# Altium schematic symbol library jlcpcb_2025_04_inductors_extended_0603.schlib: 1269 symbols (part 1 of 7)
Pins are listed as number, name and electrical type; pins without a type are passive.

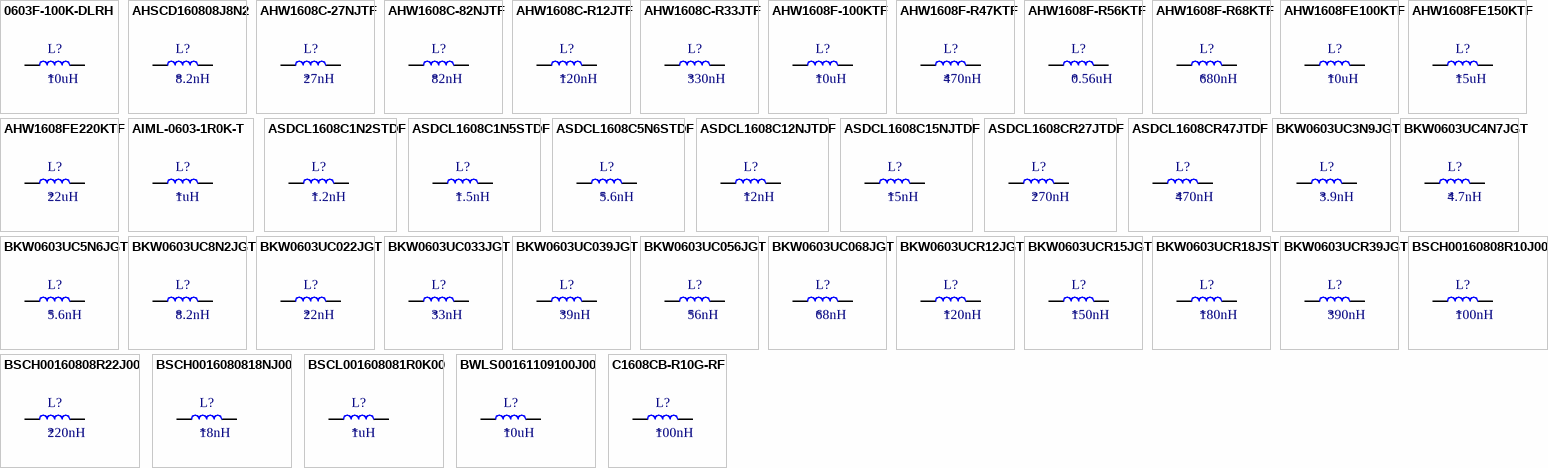
[diagram p0: symbols 0603F-100K-DLRH to C1608CB-R10G-RF]

## 0603F-100K-DLRH
designator L?  Inductance: 10uH
Inductor, 10uH, ±10%, SMD 0603; Manufacturer: PSA(Prosperity Dielectrics); Manufacturer Part Number: 0603F-100K-DLRH; Package Size: 0603; JLCPCB Basic Part: No; JLCPCB Part Number: C2874746; Supplier 1: LCSC; Category: Inductors; Supplier Part Number 1: C2874746; Tolerance: ±10%; RoHS: Yes; ComponentLink1Description: Datasheet; ComponentLink1URL: https://wmsc.lcsc.com/wmsc/upload/file/pdf/v2/lcsc/2108150330_PSA-Prosperity-Dielectrics-0603F-100K-DLRH_C2874746.pdf; ComponentLink2Description: JLCPCB Part URL; ComponentLink2URL: https://jlcpcb.com/partdetail/C2874746; ComponentLink3Description: LCSC Part URL; ComponentLink3URL: https://lcsc.com/product-detail/Inductors-SMD_PSAProsperity-Dielectrics-PSAProsperity-Dielectrics-0603F-100K-DLRH_C2874746.html
footprint IND-0603 (0603 (1608M) Inductor)
pins: 1, 2

## AHSCD160808J8N2
designator L?  Inductance: 8.2nH
Inductor, 8.2nH, ±5%, 115mΩ, 700mA, SMD 0603; Manufacturer: COILANK INTERNATIONAL; Manufacturer Part Number: AHSCD160808J8N2; Self-Resonant Frequency: 4.2GHz; Q Factor: 30; Package Size: 0603; JLCPCB Basic Part: No; JLCPCB Part Number: C3001597; Supplier 1: LCSC; Category: Inductors; Supplier Part Number 1: C3001597; Tolerance: ±5%; Rated Current: 700mA; DC Resistance: 115mΩ; RoHS: Yes; ComponentLink1Description: Datasheet; ComponentLink1URL: https://wmsc.lcsc.com/wmsc/upload/file/pdf/v2/lcsc/2204261415_COILANK-INTERNATIONAL-AHSCD160808J8N2_C3001597.pdf; ComponentLink2Description: JLCPCB Part URL; ComponentLink2URL: https://jlcpcb.com/partdetail/C3001597; ComponentLink3Description: LCSC Part URL; ComponentLink3URL: https://lcsc.com/product-detail/Inductors-SMD_COILANK-INTERNATIONAL-COILANK-INTERNATIONAL-AHSCD160808J8N2_C3001597.html
footprint IND-0603 (0603 (1608M) Inductor)
pins: 1, 2

## AHW1608C-27NJTF
designator L?  Inductance: 27nH
Inductor, 27nH, ±5%, 220mΩ, 600mA, SMD 0603; Manufacturer: APV; Manufacturer Part Number: AHW1608C-27NJTF; Self-Resonant Frequency: 2.8GHz; Q Factor: 40; Package Size: 0603; JLCPCB Basic Part: No; JLCPCB Part Number: C6807996; Supplier 1: LCSC; Category: Inductors; Supplier Part Number 1: C6807996; Tolerance: ±5%; Rated Current: 600mA; DC Resistance: 220mΩ; RoHS: Yes; ComponentLink1Description: Datasheet; ComponentLink1URL: https://wmsc.lcsc.com/wmsc/upload/file/pdf/v2/lcsc/2306211548_APV-AHW1608C-27NJTF_C6807996.pdf; ComponentLink2Description: JLCPCB Part URL; ComponentLink2URL: https://jlcpcb.com/partdetail/C6807996; ComponentLink3Description: LCSC Part URL; ComponentLink3URL: https://lcsc.com/product-detail/Inductors-SMD_APV-APV-AHW1608C-27NJTF_C6807996.html
footprint IND-0603 (0603 (1608M) Inductor)
pins: 1, 2

## AHW1608C-82NJTF
designator L?  Inductance: 82nH
Inductor, 82nH, ±5%, 0.54Ω, 400mA, SMD 0603; Manufacturer: APV; Manufacturer Part Number: AHW1608C-82NJTF; Self-Resonant Frequency: 1.7GHz; Q Factor: 34; Package Size: 0603; JLCPCB Basic Part: No; JLCPCB Part Number: C6808000; Supplier 1: LCSC; Category: Inductors; Supplier Part Number 1: C6808000; Tolerance: ±5%; Rated Current: 400mA; DC Resistance: 0.54Ω; RoHS: Yes; ComponentLink1Description: Datasheet; ComponentLink1URL: https://wmsc.lcsc.com/wmsc/upload/file/pdf/v2/lcsc/2306211548_APV-AHW1608C-82NJTF_C6808000.pdf; ComponentLink2Description: JLCPCB Part URL; ComponentLink2URL: https://jlcpcb.com/partdetail/C6808000; ComponentLink3Description: LCSC Part URL; ComponentLink3URL: https://lcsc.com/product-detail/Inductors-SMD_APV-APV-AHW1608C-82NJTF_C6808000.html
footprint IND-0603 (0603 (1608M) Inductor)
pins: 1, 2

## AHW1608C-R12JTF
designator L?  Inductance: 120nH
Inductor, 120nH, ±5%, 650mΩ, 300mA, SMD 0603; Manufacturer: APV; Manufacturer Part Number: AHW1608C-R12JTF; Self-Resonant Frequency: 1.3GHz; Q Factor: 32; Package Size: 0603; JLCPCB Basic Part: No; JLCPCB Part Number: C6364700; Supplier 1: LCSC; Category: Inductors; Supplier Part Number 1: C6364700; Tolerance: ±5%; Rated Current: 300mA; DC Resistance: 650mΩ; RoHS: Yes; ComponentLink1Description: Datasheet; ComponentLink1URL: https://wmsc.lcsc.com/wmsc/upload/file/pdf/v2/lcsc/2305231105_APV-AHW1608C-R12JTF_C6364700.pdf; ComponentLink2Description: JLCPCB Part URL; ComponentLink2URL: https://jlcpcb.com/partdetail/C6364700; ComponentLink3Description: LCSC Part URL; ComponentLink3URL: https://lcsc.com/product-detail/Inductors-SMD_APV-APV-AHW1608C-R12JTF_C6364700.html
footprint IND-0603 (0603 (1608M) Inductor)
pins: 1, 2

## AHW1608C-R33JTF
designator L?  Inductance: 330nH
Inductor, 330nH, ±5%, 3.89Ω, 100mA, SMD 0603; Manufacturer: APV; Manufacturer Part Number: AHW1608C-R33JTF; Self-Resonant Frequency: 790MHz; Q Factor: 25; Package Size: 0603; JLCPCB Basic Part: No; JLCPCB Part Number: C6808006; Supplier 1: LCSC; Category: Inductors; Supplier Part Number 1: C6808006; Tolerance: ±5%; Rated Current: 100mA; DC Resistance: 3.89Ω; RoHS: Yes; ComponentLink1Description: Datasheet; ComponentLink1URL: https://wmsc.lcsc.com/wmsc/upload/file/pdf/v2/lcsc/2306211548_APV-AHW1608C-R33JTF_C6808006.pdf; ComponentLink2Description: JLCPCB Part URL; ComponentLink2URL: https://jlcpcb.com/partdetail/C6808006; ComponentLink3Description: LCSC Part URL; ComponentLink3URL: https://lcsc.com/product-detail/Inductors-SMD_APV-APV-AHW1608C-R33JTF_C6808006.html
footprint IND-0603 (0603 (1608M) Inductor)
pins: 1, 2

## AHW1608F-100KTF
designator L?  Inductance: 10uH
Inductor, 10uH, ±10%, 4.8Ω, 180mA, SMD 0603; Manufacturer: APV; Manufacturer Part Number: AHW1608F-100KTF; Self-Resonant Frequency: 25MHz; Q Factor: 12; Package Size: 0603; JLCPCB Basic Part: No; JLCPCB Part Number: C6808009; Supplier 1: LCSC; Category: Inductors; Supplier Part Number 1: C6808009; Tolerance: ±10%; Rated Current: 180mA; DC Resistance: 4.8Ω; RoHS: Yes; ComponentLink1Description: Datasheet; ComponentLink1URL: https://wmsc.lcsc.com/wmsc/upload/file/pdf/v2/lcsc/2306211548_APV-AHW1608F-100KTF_C6808009.pdf; ComponentLink2Description: JLCPCB Part URL; ComponentLink2URL: https://jlcpcb.com/partdetail/C6808009; ComponentLink3Description: LCSC Part URL; ComponentLink3URL: https://lcsc.com/product-detail/Inductors-SMD_APV-APV-AHW1608F-100KTF_C6808009.html
footprint IND-0603 (0603 (1608M) Inductor)
pins: 1, 2

## AHW1608F-R47KTF
designator L?  Inductance: 470nH
Inductor, 470nH, ±10%, 430mΩ, 570mA, SMD 0603; Manufacturer: APV; Manufacturer Part Number: AHW1608F-R47KTF; Self-Resonant Frequency: 540MHz; Q Factor: 12; Package Size: 0603; JLCPCB Basic Part: No; JLCPCB Part Number: C6808022; Supplier 1: LCSC; Category: Inductors; Supplier Part Number 1: C6808022; Tolerance: ±10%; Rated Current: 570mA; DC Resistance: 430mΩ; RoHS: Yes; ComponentLink1Description: Datasheet; ComponentLink1URL: https://wmsc.lcsc.com/wmsc/upload/file/pdf/v2/lcsc/2306211549_APV-AHW1608F-R47KTF_C6808022.pdf; ComponentLink2Description: JLCPCB Part URL; ComponentLink2URL: https://jlcpcb.com/partdetail/C6808022; ComponentLink3Description: LCSC Part URL; ComponentLink3URL: https://lcsc.com/product-detail/Inductors-SMD_APV-APV-AHW1608F-R47KTF_C6808022.html
footprint IND-0603 (0603 (1608M) Inductor)
pins: 1, 2

## AHW1608F-R56KTF
designator L?  Inductance: 0.56uH
Inductor, 0.56uH, ±10%, 0.65Ω, 400mA, SMD 0603; Manufacturer: APV; Manufacturer Part Number: AHW1608F-R56KTF; Self-Resonant Frequency: 600MHz; Q Factor: 12; Package Size: 0603; JLCPCB Basic Part: No; JLCPCB Part Number: C6808023; Supplier 1: LCSC; Category: Inductors; Supplier Part Number 1: C6808023; Tolerance: ±10%; Rated Current: 400mA; DC Resistance: 0.65Ω; RoHS: Yes; ComponentLink1Description: Datasheet; ComponentLink1URL: https://wmsc.lcsc.com/wmsc/upload/file/pdf/v2/lcsc/2306211549_APV-AHW1608F-R56KTF_C6808023.pdf; ComponentLink2Description: JLCPCB Part URL; ComponentLink2URL: https://jlcpcb.com/partdetail/C6808023; ComponentLink3Description: LCSC Part URL; ComponentLink3URL: https://lcsc.com/product-detail/Inductors-SMD_APV-APV-AHW1608F-R56KTF_C6808023.html
footprint IND-0603 (0603 (1608M) Inductor)
pins: 1, 2

## AHW1608F-R68KTF
designator L?  Inductance: 680nH
Inductor, 680nH, ±10%, 1Ω, 380mA, SMD 0603; Manufacturer: APV; Manufacturer Part Number: AHW1608F-R68KTF; Self-Resonant Frequency: 500MHz; Q Factor: 12; Package Size: 0603; JLCPCB Basic Part: No; JLCPCB Part Number: C6808024; Supplier 1: LCSC; Category: Inductors; Supplier Part Number 1: C6808024; Tolerance: ±10%; Rated Current: 380mA; DC Resistance: 1Ω; RoHS: Yes; ComponentLink1Description: Datasheet; ComponentLink1URL: https://wmsc.lcsc.com/wmsc/upload/file/pdf/v2/lcsc/2306211549_APV-AHW1608F-R68KTF_C6808024.pdf; ComponentLink2Description: JLCPCB Part URL; ComponentLink2URL: https://jlcpcb.com/partdetail/C6808024; ComponentLink3Description: LCSC Part URL; ComponentLink3URL: https://lcsc.com/product-detail/Inductors-SMD_APV-APV-AHW1608F-R68KTF_C6808024.html
footprint IND-0603 (0603 (1608M) Inductor)
pins: 1, 2

## AHW1608FE100KTF
designator L?  Inductance: 10uH
Inductor, 10uH, ±10%, 2.4Ω, 280mA, SMD 0603; Manufacturer: APV; Manufacturer Part Number: AHW1608FE100KTF; Self-Resonant Frequency: 36MHz; Q Factor: 14; Package Size: 0603; JLCPCB Basic Part: No; JLCPCB Part Number: C6808014; Supplier 1: LCSC; Category: Inductors; Supplier Part Number 1: C6808014; Tolerance: ±10%; Rated Current: 280mA; DC Resistance: 2.4Ω; RoHS: Yes; ComponentLink1Description: Datasheet; ComponentLink1URL: https://wmsc.lcsc.com/wmsc/upload/file/pdf/v2/lcsc/2308041746_APV-AHW1608FE100KTF_C6808014.pdf; ComponentLink2Description: JLCPCB Part URL; ComponentLink2URL: https://jlcpcb.com/partdetail/C6808014; ComponentLink3Description: LCSC Part URL; ComponentLink3URL: https://lcsc.com/product-detail/Inductors-SMD_APV-APV-AHW1608FE100KTF_C6808014.html
footprint IND-0603 (0603 (1608M) Inductor)
pins: 1, 2

## AHW1608FE150KTF
designator L?  Inductance: 15uH
Inductor, 15uH, ±10%, 3.38Ω, 220mA, SMD 0603; Manufacturer: APV; Manufacturer Part Number: AHW1608FE150KTF; Self-Resonant Frequency: 29MHz; Q Factor: 14; Package Size: 0603; JLCPCB Basic Part: No; JLCPCB Part Number: C6364707; Supplier 1: LCSC; Category: Inductors; Supplier Part Number 1: C6364707; Tolerance: ±10%; Rated Current: 220mA; DC Resistance: 3.38Ω; RoHS: Yes; ComponentLink1Description: Datasheet; ComponentLink1URL: https://wmsc.lcsc.com/wmsc/upload/file/pdf/v2/lcsc/2308041745_APV-AHW1608FE150KTF_C6364707.pdf; ComponentLink2Description: JLCPCB Part URL; ComponentLink2URL: https://jlcpcb.com/partdetail/C6364707; ComponentLink3Description: LCSC Part URL; ComponentLink3URL: https://lcsc.com/product-detail/Inductors-SMD_APV-APV-AHW1608FE150KTF_C6364707.html
footprint IND-0603 (0603 (1608M) Inductor)
pins: 1, 2

## AHW1608FE220KTF
designator L?  Inductance: 22uH
Inductor, 22uH, ±10%, 4.69Ω, 200mA, SMD 0603; Manufacturer: APV; Manufacturer Part Number: AHW1608FE220KTF; Self-Resonant Frequency: 24MHz; Q Factor: 14; Package Size: 0603; JLCPCB Basic Part: No; JLCPCB Part Number: C6808015; Supplier 1: LCSC; Category: Inductors; Supplier Part Number 1: C6808015; Tolerance: ±10%; Rated Current: 200mA; DC Resistance: 4.69Ω; RoHS: Yes; ComponentLink1Description: Datasheet; ComponentLink1URL: https://wmsc.lcsc.com/wmsc/upload/file/pdf/v2/lcsc/2308041746_APV-AHW1608FE220KTF_C6808015.pdf; ComponentLink2Description: JLCPCB Part URL; ComponentLink2URL: https://jlcpcb.com/partdetail/C6808015; ComponentLink3Description: LCSC Part URL; ComponentLink3URL: https://lcsc.com/product-detail/Inductors-SMD_APV-APV-AHW1608FE220KTF_C6808015.html
footprint IND-0603 (0603 (1608M) Inductor)
pins: 1, 2

## AIML-0603-1R0K-T
designator L?  Inductance: 1uH
Inductor, 1uH, ±10%, 600mΩ, 25mA, SMD 0603; Manufacturer: Abracon LLC; Manufacturer Part Number: AIML-0603-1R0K-T; Self-Resonant Frequency: 125MHz; Q Factor: 35@10MHz; Package Size: 0603; JLCPCB Basic Part: No; JLCPCB Part Number: C2041516; Supplier 1: LCSC; Category: Inductors; Supplier Part Number 1: C2041516; Tolerance: ±10%; Rated Current: 25mA; DC Resistance: 600mΩ; RoHS: Yes; ComponentLink1Description: Datasheet; ComponentLink1URL: https://wmsc.lcsc.com/wmsc/upload/file/pdf/v2/lcsc/2304140030_Abracon-LLC-AIML-0603-1R0K-T_C2041516.pdf; ComponentLink2Description: JLCPCB Part URL; ComponentLink2URL: https://jlcpcb.com/partdetail/C2041516; ComponentLink3Description: LCSC Part URL; ComponentLink3URL: https://lcsc.com/product-detail/Inductors-SMD_Abracon-LLC-Abracon-LLC-AIML-0603-1R0K-T_C2041516.html
footprint IND-0603 (0603 (1608M) Inductor)
pins: 1, 2

## ASDCL1608C1N2STDF
designator L?  Inductance: 1.2nH
Inductor, 1.2nH, 50mΩ, 500mA, SMD 0603; Manufacturer: Sunlord; Manufacturer Part Number: ASDCL1608C1N2STDF; Self-Resonant Frequency: 10GHz; Q Factor: 8@100MHz; Package Size: 0603; JLCPCB Basic Part: No; JLCPCB Part Number: C2846485; Supplier 1: LCSC; Category: Inductors; Supplier Part Number 1: C2846485; Rated Current: 500mA; DC Resistance: 50mΩ; RoHS: Yes; ComponentLink1Description: Datasheet; ComponentLink1URL: https://wmsc.lcsc.com/wmsc/upload/file/pdf/v2/lcsc/2310301640_Sunlord-ASDCL1608C1N2STDF_C2846485.pdf; ComponentLink2Description: JLCPCB Part URL; ComponentLink2URL: https://jlcpcb.com/partdetail/C2846485; ComponentLink3Description: LCSC Part URL; ComponentLink3URL: https://lcsc.com/product-detail/Inductors-SMD_Sunlord-Sunlord-ASDCL1608C1N2STDF_C2846485.html
footprint IND-0603 (0603 (1608M) Inductor)
pins: 1, 2

## ASDCL1608C1N5STDF
designator L?  Inductance: 1.5nH
Inductor, 1.5nH, 100mΩ, 500mA, SMD 0603; Manufacturer: Sunlord; Manufacturer Part Number: ASDCL1608C1N5STDF; Self-Resonant Frequency: 6GHz; Q Factor: 8@100MHz; Package Size: 0603; JLCPCB Basic Part: No; JLCPCB Part Number: C2846486; Supplier 1: LCSC; Category: Inductors; Supplier Part Number 1: C2846486; Rated Current: 500mA; DC Resistance: 100mΩ; RoHS: Yes; ComponentLink1Description: Datasheet; ComponentLink1URL: https://wmsc.lcsc.com/wmsc/upload/file/pdf/v2/lcsc/2310301640_Sunlord-ASDCL1608C1N5STDF_C2846486.pdf; ComponentLink2Description: JLCPCB Part URL; ComponentLink2URL: https://jlcpcb.com/partdetail/C2846486; ComponentLink3Description: LCSC Part URL; ComponentLink3URL: https://lcsc.com/product-detail/Inductors-SMD_Sunlord-Sunlord-ASDCL1608C1N5STDF_C2846486.html
footprint IND-0603 (0603 (1608M) Inductor)
pins: 1, 2

## ASDCL1608C5N6STDF
designator L?  Inductance: 5.6nH
Inductor, 5.6nH, 500mA, SMD 0603; Manufacturer: Sunlord; Manufacturer Part Number: ASDCL1608C5N6STDF; Package Size: 0603; JLCPCB Basic Part: No; JLCPCB Part Number: C2846493; Supplier 1: LCSC; Category: Inductors; Supplier Part Number 1: C2846493; Rated Current: 500mA; RoHS: Yes; ComponentLink1Description: Datasheet; ComponentLink1URL: https://wmsc.lcsc.com/wmsc/upload/file/pdf/v2/lcsc/2310301640_Sunlord-ASDCL1608C5N6STDF_C2846493.pdf; ComponentLink2Description: JLCPCB Part URL; ComponentLink2URL: https://jlcpcb.com/partdetail/C2846493; ComponentLink3Description: LCSC Part URL; ComponentLink3URL: https://lcsc.com/product-detail/Inductors-SMD_Sunlord-Sunlord-ASDCL1608C5N6STDF_C2846493.html
footprint IND-0603 (0603 (1608M) Inductor)
pins: 1, 2

## ASDCL1608C12NJTDF
designator L?  Inductance: 12nH
Inductor, 12nH, ±5%, 450mΩ, 300mA, SMD 0603; Manufacturer: Sunlord; Manufacturer Part Number: ASDCL1608C12NJTDF; Self-Resonant Frequency: 3GHz; Q Factor: 12@100MHz; Package Size: 0603; JLCPCB Basic Part: No; JLCPCB Part Number: C2846497; Supplier 1: LCSC; Category: Inductors; Supplier Part Number 1: C2846497; Tolerance: ±5%; Rated Current: 300mA; DC Resistance: 450mΩ; RoHS: Yes; ComponentLink1Description: Datasheet; ComponentLink1URL: https://wmsc.lcsc.com/wmsc/upload/file/pdf/v2/lcsc/2310301640_Sunlord-ASDCL1608C12NJTDF_C2846497.pdf; ComponentLink2Description: JLCPCB Part URL; ComponentLink2URL: https://jlcpcb.com/partdetail/C2846497; ComponentLink3Description: LCSC Part URL; ComponentLink3URL: https://lcsc.com/product-detail/Inductors-SMD_Sunlord-Sunlord-ASDCL1608C12NJTDF_C2846497.html
footprint IND-0603 (0603 (1608M) Inductor)
pins: 1, 2

## ASDCL1608C15NJTDF
designator L?  Inductance: 15nH
Inductor, 15nH, ±5%, 500mΩ, 300mA, SMD 0603; Manufacturer: Sunlord; Manufacturer Part Number: ASDCL1608C15NJTDF; Self-Resonant Frequency: 2.3GHz; Q Factor: 12@100MHz; Package Size: 0603; JLCPCB Basic Part: No; JLCPCB Part Number: C2846498; Supplier 1: LCSC; Category: Inductors; Supplier Part Number 1: C2846498; Tolerance: ±5%; Rated Current: 300mA; DC Resistance: 500mΩ; RoHS: Yes; ComponentLink1Description: Datasheet; ComponentLink1URL: https://wmsc.lcsc.com/wmsc/upload/file/pdf/v2/lcsc/2310301640_Sunlord-ASDCL1608C15NJTDF_C2846498.pdf; ComponentLink2Description: JLCPCB Part URL; ComponentLink2URL: https://jlcpcb.com/partdetail/C2846498; ComponentLink3Description: LCSC Part URL; ComponentLink3URL: https://lcsc.com/product-detail/Inductors-SMD_Sunlord-Sunlord-ASDCL1608C15NJTDF_C2846498.html
footprint IND-0603 (0603 (1608M) Inductor)
pins: 1, 2

## ASDCL1608CR27JTDF
designator L?  Inductance: 270nH
Inductor, 270nH, ±5%, 2.6Ω, 150mA, SMD 0603; Manufacturer: Sunlord; Manufacturer Part Number: ASDCL1608CR27JTDF; Self-Resonant Frequency: 350MHz; Q Factor: 8@50MHz; Package Size: 0603; JLCPCB Basic Part: No; JLCPCB Part Number: C2846513; Supplier 1: LCSC; Category: Inductors; Supplier Part Number 1: C2846513; Tolerance: ±5%; Rated Current: 150mA; DC Resistance: 2.6Ω; RoHS: Yes; ComponentLink1Description: Datasheet; ComponentLink1URL: https://wmsc.lcsc.com/wmsc/upload/file/pdf/v2/lcsc/2310301640_Sunlord-ASDCL1608CR27JTDF_C2846513.pdf; ComponentLink2Description: JLCPCB Part URL; ComponentLink2URL: https://jlcpcb.com/partdetail/C2846513; ComponentLink3Description: LCSC Part URL; ComponentLink3URL: https://lcsc.com/product-detail/Inductors-SMD_Sunlord-Sunlord-ASDCL1608CR27JTDF_C2846513.html
footprint IND-0603 (0603 (1608M) Inductor)
pins: 1, 2

## ASDCL1608CR47JTDF
designator L?  Inductance: 470nH
Inductor, 470nH, ±5%, 150mA, SMD 0603; Manufacturer: Sunlord; Manufacturer Part Number: ASDCL1608CR47JTDF; Package Size: 0603; JLCPCB Basic Part: No; JLCPCB Part Number: C2846517; Supplier 1: LCSC; Category: Inductors; Supplier Part Number 1: C2846517; Tolerance: ±5%; Rated Current: 150mA; RoHS: Yes; ComponentLink1Description: Datasheet; ComponentLink1URL: https://wmsc.lcsc.com/wmsc/upload/file/pdf/v2/lcsc/2310301640_Sunlord-ASDCL1608CR47JTDF_C2846517.pdf; ComponentLink2Description: JLCPCB Part URL; ComponentLink2URL: https://jlcpcb.com/partdetail/C2846517; ComponentLink3Description: LCSC Part URL; ComponentLink3URL: https://lcsc.com/product-detail/Inductors-SMD_Sunlord-Sunlord-ASDCL1608CR47JTDF_C2846517.html
footprint IND-0603 (0603 (1608M) Inductor)
pins: 1, 2

## BKW0603UC3N9JGT
designator L?  Inductance: 3.9nH
Inductor, 3.9nH, ±5%, 80mΩ, 700mA, SMD 0603; Manufacturer: FH-BK(Guangdong Fenghua Bangke Elec); Manufacturer Part Number: BKW0603UC3N9JGT; Package Size: 0603; JLCPCB Basic Part: No; JLCPCB Part Number: C98517; Supplier 1: LCSC; Category: Inductors; Supplier Part Number 1: C98517; Tolerance: ±5%; Rated Current: 700mA; DC Resistance: 80mΩ; RoHS: Yes; ComponentLink1Description: Datasheet; ComponentLink1URL: https://wmsc.lcsc.com/wmsc/upload/file/pdf/v2/lcsc/2304140030_FH-BK-Guangdong-Fenghua-Bangke-Elec-BKW0603UC3N9JGT_C98517.pdf; ComponentLink2Description: JLCPCB Part URL; ComponentLink2URL: https://jlcpcb.com/partdetail/C98517; ComponentLink3Description: LCSC Part URL; ComponentLink3URL: https://lcsc.com/product-detail/Inductors-SMD_FH-BKGuangdong-Fenghua-Bangke-Elec-FH-BKGuangdong-Fenghua-Bangke-Elec-BKW0603UC3N9JGT_C98517.html
footprint IND-0603 (0603 (1608M) Inductor)
pins: 1, 2

## BKW0603UC4N7JGT
designator L?  Inductance: 4.7nH
Inductor, 4.7nH, ±5%, 116mΩ, 700mA, SMD 0603; Manufacturer: FH-BK(Guangdong Fenghua Bangke Elec); Manufacturer Part Number: BKW0603UC4N7JGT; Package Size: 0603; JLCPCB Basic Part: No; JLCPCB Part Number: C98515; Supplier 1: LCSC; Category: Inductors; Supplier Part Number 1: C98515; Tolerance: ±5%; Rated Current: 700mA; DC Resistance: 116mΩ; RoHS: Yes; ComponentLink1Description: Datasheet; ComponentLink1URL: https://wmsc.lcsc.com/wmsc/upload/file/pdf/v2/lcsc/2304140030_FH-BK-Guangdong-Fenghua-Bangke-Elec-BKW0603UC4N7JGT_C98515.pdf; ComponentLink2Description: JLCPCB Part URL; ComponentLink2URL: https://jlcpcb.com/partdetail/C98515; ComponentLink3Description: LCSC Part URL; ComponentLink3URL: https://lcsc.com/product-detail/Inductors-SMD_FH-BKGuangdong-Fenghua-Bangke-Elec-FH-BKGuangdong-Fenghua-Bangke-Elec-BKW0603UC4N7JGT_C98515.html
footprint IND-0603 (0603 (1608M) Inductor)
pins: 1, 2

## BKW0603UC5N6JGT
designator L?  Inductance: 5.6nH
Inductor, 5.6nH, ±5%, 200mΩ, 700mA, SMD 0603; Manufacturer: FH-BK(Guangdong Fenghua Bangke Elec); Manufacturer Part Number: BKW0603UC5N6JGT; Package Size: 0603; JLCPCB Basic Part: No; JLCPCB Part Number: C98518; Supplier 1: LCSC; Category: Inductors; Supplier Part Number 1: C98518; Tolerance: ±5%; Rated Current: 700mA; DC Resistance: 200mΩ; RoHS: Yes; ComponentLink1Description: Datasheet; ComponentLink1URL: https://wmsc.lcsc.com/wmsc/upload/file/pdf/v2/lcsc/2304140030_FH-BK-Guangdong-Fenghua-Bangke-Elec-BKW0603UC5N6JGT_C98518.pdf; ComponentLink2Description: JLCPCB Part URL; ComponentLink2URL: https://jlcpcb.com/partdetail/C98518; ComponentLink3Description: LCSC Part URL; ComponentLink3URL: https://lcsc.com/product-detail/Inductors-SMD_FH-BKGuangdong-Fenghua-Bangke-Elec-FH-BKGuangdong-Fenghua-Bangke-Elec-BKW0603UC5N6JGT_C98518.html
footprint IND-0603 (0603 (1608M) Inductor)
pins: 1, 2

## BKW0603UC8N2JGT
designator L?  Inductance: 8.2nH
Inductor, 8.2nH, ±5%, 120mΩ, 700mA, SMD 0603; Manufacturer: FH-BK(Guangdong Fenghua Bangke Elec); Manufacturer Part Number: BKW0603UC8N2JGT; Package Size: 0603; JLCPCB Basic Part: No; JLCPCB Part Number: C98519; Supplier 1: LCSC; Category: Inductors; Supplier Part Number 1: C98519; Tolerance: ±5%; Rated Current: 700mA; DC Resistance: 120mΩ; RoHS: Yes; ComponentLink1Description: Datasheet; ComponentLink1URL: https://wmsc.lcsc.com/wmsc/upload/file/pdf/v2/lcsc/2304140030_FH-BK-Guangdong-Fenghua-Bangke-Elec-BKW0603UC8N2JGT_C98519.pdf; ComponentLink2Description: JLCPCB Part URL; ComponentLink2URL: https://jlcpcb.com/partdetail/C98519; ComponentLink3Description: LCSC Part URL; ComponentLink3URL: https://lcsc.com/product-detail/Inductors-SMD_FH-BKGuangdong-Fenghua-Bangke-Elec-FH-BKGuangdong-Fenghua-Bangke-Elec-BKW0603UC8N2JGT_C98519.html
footprint IND-0603 (0603 (1608M) Inductor)
pins: 1, 2

## BKW0603UC022JGT
designator L?  Inductance: 22nH
Inductor, 22nH, ±5%, 190mΩ, 700mA, SMD 0603; Manufacturer: FH-BK(Guangdong Fenghua Bangke Elec); Manufacturer Part Number: BKW0603UC022JGT; Package Size: 0603; JLCPCB Basic Part: No; JLCPCB Part Number: C98525; Supplier 1: LCSC; Category: Inductors; Supplier Part Number 1: C98525; Tolerance: ±5%; Rated Current: 700mA; DC Resistance: 190mΩ; RoHS: Yes; ComponentLink1Description: Datasheet; ComponentLink1URL: https://wmsc.lcsc.com/wmsc/upload/file/pdf/v2/lcsc/2304140030_FH-BK-Guangdong-Fenghua-Bangke-Elec-BKW0603UC022JGT_C98525.pdf; ComponentLink2Description: JLCPCB Part URL; ComponentLink2URL: https://jlcpcb.com/partdetail/C98525; ComponentLink3Description: LCSC Part URL; ComponentLink3URL: https://lcsc.com/product-detail/Inductors-SMD_FH-BKGuangdong-Fenghua-Bangke-Elec-FH-BKGuangdong-Fenghua-Bangke-Elec-BKW0603UC022JGT_C98525.html
footprint IND-0603 (0603 (1608M) Inductor)
pins: 1, 2

## BKW0603UC033JGT
designator L?  Inductance: 33nH
Inductor, 33nH, ±5%, 220mΩ, 600mA, SMD 0603; Manufacturer: FH-BK(Guangdong Fenghua Bangke Elec); Manufacturer Part Number: BKW0603UC033JGT; Package Size: 0603; JLCPCB Basic Part: No; JLCPCB Part Number: C98529; Supplier 1: LCSC; Category: Inductors; Supplier Part Number 1: C98529; Tolerance: ±5%; Rated Current: 600mA; DC Resistance: 220mΩ; RoHS: Yes; ComponentLink1Description: Datasheet; ComponentLink1URL: https://wmsc.lcsc.com/wmsc/upload/file/pdf/v2/lcsc/2304140030_FH-BK-Guangdong-Fenghua-Bangke-Elec-BKW0603UC033JGT_C98529.pdf; ComponentLink2Description: JLCPCB Part URL; ComponentLink2URL: https://jlcpcb.com/partdetail/C98529; ComponentLink3Description: LCSC Part URL; ComponentLink3URL: https://lcsc.com/product-detail/Inductors-SMD_FH-BKGuangdong-Fenghua-Bangke-Elec-FH-BKGuangdong-Fenghua-Bangke-Elec-BKW0603UC033JGT_C98529.html
footprint IND-0603 (0603 (1608M) Inductor)
pins: 1, 2

## BKW0603UC039JGT
designator L?  Inductance: 39nH
Inductor, 39nH, ±5%, 250mΩ, 600mA, SMD 0603; Manufacturer: FH-BK(Guangdong Fenghua Bangke Elec); Manufacturer Part Number: BKW0603UC039JGT; Package Size: 0603; JLCPCB Basic Part: No; JLCPCB Part Number: C316243; Supplier 1: LCSC; Category: Inductors; Supplier Part Number 1: C316243; Tolerance: ±5%; Rated Current: 600mA; DC Resistance: 250mΩ; RoHS: Yes; ComponentLink1Description: Datasheet; ComponentLink1URL: https://wmsc.lcsc.com/wmsc/upload/file/pdf/v2/lcsc/1811011940_FH-BK-Guangdong-Fenghua-Bangke-Elec-BKW0603UC039JGT_C316243.pdf; ComponentLink2Description: JLCPCB Part URL; ComponentLink2URL: https://jlcpcb.com/partdetail/C316243; ComponentLink3Description: LCSC Part URL; ComponentLink3URL: https://lcsc.com/product-detail/Inductors-SMD_FH-BKGuangdong-Fenghua-Bangke-Elec-FH-BKGuangdong-Fenghua-Bangke-Elec-BKW0603UC039JGT_C316243.html
footprint IND-0603 (0603 (1608M) Inductor)
pins: 1, 2

## BKW0603UC056JGT
designator L?  Inductance: 56nH
Inductor, 56nH, ±5%, 280mΩ, 600mA, SMD 0603; Manufacturer: FH-BK(Guangdong Fenghua Bangke Elec); Manufacturer Part Number: BKW0603UC056JGT; Package Size: 0603; JLCPCB Basic Part: No; JLCPCB Part Number: C98523; Supplier 1: LCSC; Category: Inductors; Supplier Part Number 1: C98523; Tolerance: ±5%; Rated Current: 600mA; DC Resistance: 280mΩ; RoHS: Yes; ComponentLink1Description: Datasheet; ComponentLink1URL: https://wmsc.lcsc.com/wmsc/upload/file/pdf/v2/lcsc/2304140030_FH-BK-Guangdong-Fenghua-Bangke-Elec-BKW0603UC056JGT_C98523.pdf; ComponentLink2Description: JLCPCB Part URL; ComponentLink2URL: https://jlcpcb.com/partdetail/C98523; ComponentLink3Description: LCSC Part URL; ComponentLink3URL: https://lcsc.com/product-detail/Inductors-SMD_FH-BKGuangdong-Fenghua-Bangke-Elec-FH-BKGuangdong-Fenghua-Bangke-Elec-BKW0603UC056JGT_C98523.html
footprint IND-0603 (0603 (1608M) Inductor)
pins: 1, 2

## BKW0603UC068JGT
designator L?  Inductance: 68nH
Inductor, 68nH, ±5%, 340mΩ, 600mA, SMD 0603; Manufacturer: FH-BK(Guangdong Fenghua Bangke Elec); Manufacturer Part Number: BKW0603UC068JGT; Package Size: 0603; JLCPCB Basic Part: No; JLCPCB Part Number: C98522; Supplier 1: LCSC; Category: Inductors; Supplier Part Number 1: C98522; Tolerance: ±5%; Rated Current: 600mA; DC Resistance: 340mΩ; RoHS: Yes; ComponentLink1Description: Datasheet; ComponentLink1URL: https://wmsc.lcsc.com/wmsc/upload/file/pdf/v2/lcsc/2304140030_FH-BK-Guangdong-Fenghua-Bangke-Elec-BKW0603UC068JGT_C98522.pdf; ComponentLink2Description: JLCPCB Part URL; ComponentLink2URL: https://jlcpcb.com/partdetail/C98522; ComponentLink3Description: LCSC Part URL; ComponentLink3URL: https://lcsc.com/product-detail/Inductors-SMD_FH-BKGuangdong-Fenghua-Bangke-Elec-FH-BKGuangdong-Fenghua-Bangke-Elec-BKW0603UC068JGT_C98522.html
footprint IND-0603 (0603 (1608M) Inductor)
pins: 1, 2

## BKW0603UCR12JGT
designator L?  Inductance: 120nH
Inductor, 120nH, ±5%, 730mΩ, 300mA, SMD 0603; Manufacturer: FH-BK(Guangdong Fenghua Bangke Elec); Manufacturer Part Number: BKW0603UCR12JGT; Package Size: 0603; JLCPCB Basic Part: No; JLCPCB Part Number: C361661; Supplier 1: LCSC; Category: Inductors; Supplier Part Number 1: C361661; Tolerance: ±5%; Rated Current: 300mA; DC Resistance: 730mΩ; RoHS: Yes; ComponentLink1Description: Datasheet; ComponentLink1URL: https://wmsc.lcsc.com/wmsc/upload/file/pdf/v2/lcsc/1912111437_FH-BK-Guangdong-Fenghua-Bangke-Elec-BKW0603UCR12JGT_C361661.pdf; ComponentLink2Description: JLCPCB Part URL; ComponentLink2URL: https://jlcpcb.com/partdetail/C361661; ComponentLink3Description: LCSC Part URL; ComponentLink3URL: https://lcsc.com/product-detail/Inductors-SMD_FH-BKGuangdong-Fenghua-Bangke-Elec-FH-BKGuangdong-Fenghua-Bangke-Elec-BKW0603UCR12JGT_C361661.html
footprint IND-0603 (0603 (1608M) Inductor)
pins: 1, 2

## BKW0603UCR15JGT
designator L?  Inductance: 150nH
Inductor, 150nH, ±5%, 800mΩ, 280mA, SMD 0603; Manufacturer: FH-BK(Guangdong Fenghua Bangke Elec); Manufacturer Part Number: BKW0603UCR15JGT; Package Size: 0603; JLCPCB Basic Part: No; JLCPCB Part Number: C185913; Supplier 1: LCSC; Category: Inductors; Supplier Part Number 1: C185913; Tolerance: ±5%; Rated Current: 280mA; DC Resistance: 800mΩ; RoHS: Yes; ComponentLink1Description: Datasheet; ComponentLink1URL: https://wmsc.lcsc.com/wmsc/upload/file/pdf/v2/lcsc/2304140030_FH-BK-Guangdong-Fenghua-Bangke-Elec-BKW0603UCR15JGT_C185913.pdf; ComponentLink2Description: JLCPCB Part URL; ComponentLink2URL: https://jlcpcb.com/partdetail/C185913; ComponentLink3Description: LCSC Part URL; ComponentLink3URL: https://lcsc.com/product-detail/Inductors-SMD_FH-BKGuangdong-Fenghua-Bangke-Elec-FH-BKGuangdong-Fenghua-Bangke-Elec-BKW0603UCR15JGT_C185913.html
footprint IND-0603 (0603 (1608M) Inductor)
pins: 1, 2

## BKW0603UCR18JST
designator L?  Inductance: 180nH
Inductor, 180nH, ±5%, SMD 0603; Manufacturer: FH-BK(Guangdong Fenghua Bangke Elec); Manufacturer Part Number: BKW0603UCR18JST; Package Size: 0603; JLCPCB Basic Part: No; JLCPCB Part Number: C361662; Supplier 1: LCSC; Category: Inductors; Supplier Part Number 1: C361662; Tolerance: ±5%; RoHS: Yes; ComponentLink1Description: Datasheet; ComponentLink1URL: https://wmsc.lcsc.com/wmsc/upload/file/pdf/v2/lcsc/2304140030_FH-BK-Guangdong-Fenghua-Bangke-Elec-BKW0603UCR18JST_C361662.pdf; ComponentLink2Description: JLCPCB Part URL; ComponentLink2URL: https://jlcpcb.com/partdetail/C361662; ComponentLink3Description: LCSC Part URL; ComponentLink3URL: https://lcsc.com/product-detail/Inductors-SMD_FH-BKGuangdong-Fenghua-Bangke-Elec-FH-BKGuangdong-Fenghua-Bangke-Elec-BKW0603UCR18JST_C361662.html
footprint IND-0603 (0603 (1608M) Inductor)
pins: 1, 2

## BKW0603UCR39JGT
designator L?  Inductance: 390nH
Inductor, 390nH, ±5%, 4.35Ω, 100mA, SMD 0603; Manufacturer: FH-BK(Guangdong Fenghua Bangke Elec); Manufacturer Part Number: BKW0603UCR39JGT; Package Size: 0603; JLCPCB Basic Part: No; JLCPCB Part Number: C107477; Supplier 1: LCSC; Category: Inductors; Supplier Part Number 1: C107477; Tolerance: ±5%; Rated Current: 100mA; DC Resistance: 4.35Ω; RoHS: Yes; ComponentLink1Description: Datasheet; ComponentLink1URL: https://wmsc.lcsc.com/wmsc/upload/file/pdf/v2/lcsc/2304140030_FH-BK-Guangdong-Fenghua-Bangke-Elec-BKW0603UCR39JGT_C107477.pdf; ComponentLink2Description: JLCPCB Part URL; ComponentLink2URL: https://jlcpcb.com/partdetail/C107477; ComponentLink3Description: LCSC Part URL; ComponentLink3URL: https://lcsc.com/product-detail/Inductors-SMD_FH-BKGuangdong-Fenghua-Bangke-Elec-FH-BKGuangdong-Fenghua-Bangke-Elec-BKW0603UCR39JGT_C107477.html
footprint IND-0603 (0603 (1608M) Inductor)
pins: 1, 2

## BSCH00160808R10J00
designator L?  Inductance: 100nH
Inductor, 100nH, ±5%, SMD 0603; Manufacturer: Chilisin Elec; Manufacturer Part Number: BSCH00160808R10J00; Package Size: 0603; JLCPCB Basic Part: No; JLCPCB Part Number: C2981212; Supplier 1: LCSC; Category: Inductors; Supplier Part Number 1: C2981212; Tolerance: ±5%; RoHS: Yes; ComponentLink1Description: Datasheet; ComponentLink1URL: https://wmsc.lcsc.com/wmsc/upload/file/pdf/v2/lcsc/2203101903_Chilisin-Elec-BSCH00160808R10J00_C2981212.pdf; ComponentLink2Description: JLCPCB Part URL; ComponentLink2URL: https://jlcpcb.com/partdetail/C2981212; ComponentLink3Description: LCSC Part URL; ComponentLink3URL: https://lcsc.com/product-detail/Power-Inductors_Chilisin-Elec-Chilisin-Elec-BSCH00160808R10J00_C2981212.html
footprint IND-0603 (0603 (1608M) Inductor)
pins: 1, 2

## BSCH00160808R22J00
designator L?  Inductance: 220nH
Inductor, 220nH, ±5%, SMD 0603; Manufacturer: Chilisin Elec; Manufacturer Part Number: BSCH00160808R22J00; Package Size: 0603; JLCPCB Basic Part: No; JLCPCB Part Number: C3911145; Supplier 1: LCSC; Category: Inductors; Supplier Part Number 1: C3911145; Tolerance: ±5%; RoHS: Yes; ComponentLink1Description: Datasheet; ComponentLink1URL: https://wmsc.lcsc.com/wmsc/upload/file/pdf/v2/lcsc/2403291732_Chilisin-Elec-BSCH00160808R22J00_C3911145.pdf; ComponentLink2Description: JLCPCB Part URL; ComponentLink2URL: https://jlcpcb.com/partdetail/C3911145; ComponentLink3Description: LCSC Part URL; ComponentLink3URL: https://lcsc.com/product-detail/Power-Inductors_Chilisin-Elec-Chilisin-Elec-BSCH00160808R22J00_C3911145.html
footprint IND-0603 (0603 (1608M) Inductor)
pins: 1, 2

## BSCH0016080818NJ00
designator L?  Inductance: 18nH
Inductor, 18nH, ±5%, SMD 0603; Manufacturer: Chilisin Elec; Manufacturer Part Number: BSCH0016080818NJ00; Package Size: 0603; JLCPCB Basic Part: No; JLCPCB Part Number: C2981211; Supplier 1: LCSC; Category: Inductors; Supplier Part Number 1: C2981211; Tolerance: ±5%; RoHS: Yes; ComponentLink1Description: Datasheet; ComponentLink1URL: https://wmsc.lcsc.com/wmsc/upload/file/pdf/v2/lcsc/2203102158_Chilisin-Elec-BSCH0016080818NJ00_C2981211.pdf; ComponentLink2Description: JLCPCB Part URL; ComponentLink2URL: https://jlcpcb.com/partdetail/C2981211; ComponentLink3Description: LCSC Part URL; ComponentLink3URL: https://lcsc.com/product-detail/Power-Inductors_Chilisin-Elec-Chilisin-Elec-BSCH0016080818NJ00_C2981211.html
footprint IND-0603 (0603 (1608M) Inductor)
pins: 1, 2

## BSCL001608081R0K00
designator L?  Inductance: 1uH
Inductor, 1uH, ±10%, SMD 0603; Manufacturer: Chilisin Elec; Manufacturer Part Number: BSCL001608081R0K00; Package Size: 0603; JLCPCB Basic Part: No; JLCPCB Part Number: C2981213; Supplier 1: LCSC; Category: Inductors; Supplier Part Number 1: C2981213; Tolerance: ±10%; RoHS: Yes; ComponentLink1Description: Datasheet; ComponentLink1URL: https://wmsc.lcsc.com/wmsc/upload/file/pdf/v2/lcsc/2203101903_Chilisin-Elec-BSCL001608081R0K00_C2981213.pdf; ComponentLink2Description: JLCPCB Part URL; ComponentLink2URL: https://jlcpcb.com/partdetail/C2981213; ComponentLink3Description: LCSC Part URL; ComponentLink3URL: https://lcsc.com/product-detail/Power-Inductors_Chilisin-Elec-Chilisin-Elec-BSCL001608081R0K00_C2981213.html
footprint IND-0603 (0603 (1608M) Inductor)
pins: 1, 2

## BWLS00161109100J00
designator L?  Inductance: 10uH
Inductor, 10uH, ±5%, 4.8Ω, 300mA, SMD 0603; Manufacturer: Chilisin Elec; Manufacturer Part Number: BWLS00161109100J00; Self-Resonant Frequency: 40MHz; Q Factor: 19@7.9MHz; Package Size: 0603; JLCPCB Basic Part: No; JLCPCB Part Number: C2847098; Supplier 1: LCSC; Category: Inductors; Supplier Part Number 1: C2847098; Tolerance: ±5%; Rated Current: 300mA; DC Resistance: 4.8Ω; RoHS: Yes; ComponentLink1Description: Datasheet; ComponentLink1URL: https://wmsc.lcsc.com/wmsc/upload/file/pdf/v2/lcsc/2108142130_Chilisin-Elec-BWLS00161109100J00_C2847098.pdf; ComponentLink2Description: JLCPCB Part URL; ComponentLink2URL: https://jlcpcb.com/partdetail/C2847098; ComponentLink3Description: LCSC Part URL; ComponentLink3URL: https://lcsc.com/product-detail/Inductors-SMD_Chilisin-Elec-Chilisin-Elec-BWLS00161109100J00_C2847098.html
footprint IND-0603 (0603 (1608M) Inductor)
pins: 1, 2

## C1608CB-R10G-RF
designator L?  Inductance: 100nH
Inductor, 100nH, SMD 0603; Manufacturer: SAGAMI; Manufacturer Part Number: C1608CB-R10G-RF; Package Size: 0603; JLCPCB Basic Part: No; JLCPCB Part Number: C2944377; Supplier 1: LCSC; Category: Inductors; Supplier Part Number 1: C2944377; RoHS: Yes; ComponentLink1Description: Datasheet; ComponentLink1URL: https://wmsc.lcsc.com/wmsc/upload/file/pdf/v2/lcsc/2208241730_SAGAMI-C1608CB-R10G-RF_C2944377.pdf; ComponentLink2Description: JLCPCB Part URL; ComponentLink2URL: https://jlcpcb.com/partdetail/C2944377; ComponentLink3Description: LCSC Part URL; ComponentLink3URL: https://lcsc.com/product-detail/Inductors-SMD_SAGAMI-SAGAMI-C1608CB-R10G-RF_C2944377.html
footprint IND-0603 (0603 (1608M) Inductor)
pins: 1, 2

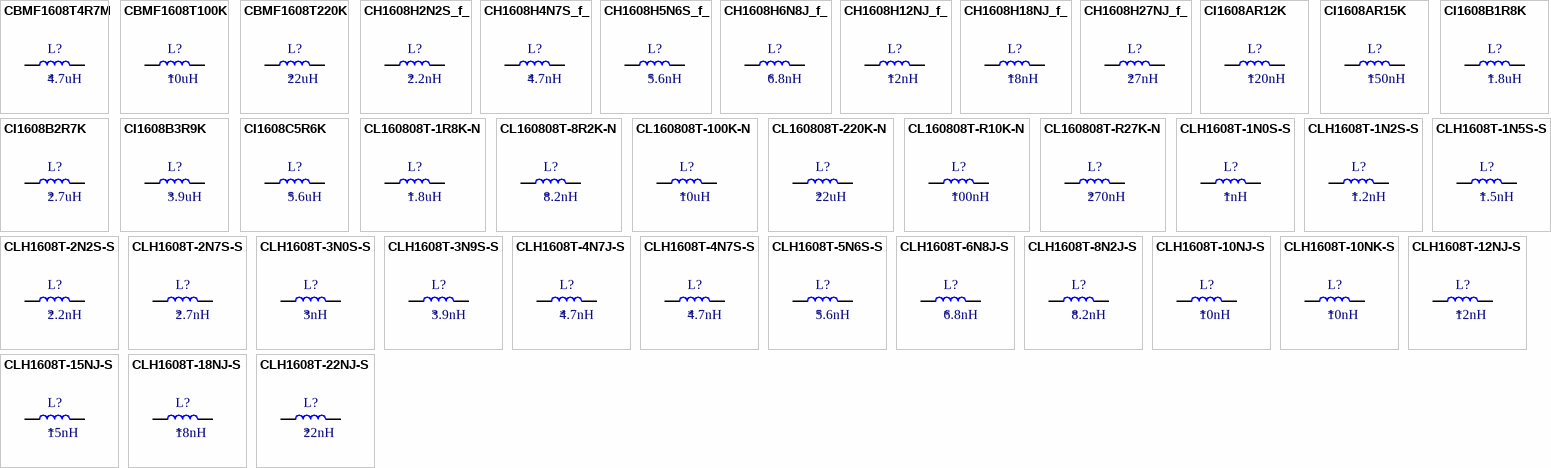
[diagram p1: symbols CBMF1608T4R7M to CLH1608T-22NJ-S]

## CBMF1608T4R7M
designator L?  Inductance: 4.7uH
Inductor, 4.7uH, ±20%, 312mΩ, 145mA, SMD 0603; Manufacturer: Taiyo Yuden; Manufacturer Part Number: CBMF1608T4R7M; Self-Resonant Frequency: 45MHz; Package Size: 0603; JLCPCB Basic Part: No; JLCPCB Part Number: C92984; Supplier 1: LCSC; Category: Inductors; Supplier Part Number 1: C92984; Tolerance: ±20%; Rated Current: 145mA; Saturation Current: 145mA; DC Resistance: 312mΩ; RoHS: Yes; ComponentLink1Description: Datasheet; ComponentLink1URL: https://wmsc.lcsc.com/wmsc/upload/file/pdf/v2/lcsc/1810091458_Taiyo-Yuden-CBMF1608T4R7M_C92984.pdf; ComponentLink2Description: JLCPCB Part URL; ComponentLink2URL: https://jlcpcb.com/partdetail/C92984; ComponentLink3Description: LCSC Part URL; ComponentLink3URL: https://lcsc.com/product-detail/Inductors-SMD_Taiyo-Yuden-Taiyo-Yuden-CBMF1608T4R7M_C92984.html
footprint IND-0603 (0603 (1608M) Inductor)
pins: 1, 2

## CBMF1608T100K
designator L?  Inductance: 10uH
Inductor, 10uH, ±10%, 468mΩ, 115mA, SMD 0603; Manufacturer: Taiyo Yuden; Manufacturer Part Number: CBMF1608T100K; Self-Resonant Frequency: 2.52MHz; Package Size: 0603; JLCPCB Basic Part: No; JLCPCB Part Number: C92982; Supplier 1: LCSC; Category: Inductors; Supplier Part Number 1: C92982; Tolerance: ±10%; Rated Current: 115mA; Saturation Current: 115mA; DC Resistance: 468mΩ; RoHS: Yes; ComponentLink1Description: Datasheet; ComponentLink1URL: https://wmsc.lcsc.com/wmsc/upload/file/pdf/v2/lcsc/2403251053_Taiyo-Yuden-CBMF1608T100K_C92982.pdf; ComponentLink2Description: JLCPCB Part URL; ComponentLink2URL: https://jlcpcb.com/partdetail/C92982; ComponentLink3Description: LCSC Part URL; ComponentLink3URL: https://lcsc.com/product-detail/Inductors-SMD_Taiyo-Yuden-Taiyo-Yuden-CBMF1608T100K_C92982.html
footprint IND-0603 (0603 (1608M) Inductor)
pins: 1, 2

## CBMF1608T220K
designator L?  Inductance: 22uH
Inductor, 22uH, ±10%, 1Ω, 70mA, SMD 0603; Manufacturer: Taiyo Yuden; Manufacturer Part Number: CBMF1608T220K; Self-Resonant Frequency: 16MHz; Package Size: 0603; JLCPCB Basic Part: No; JLCPCB Part Number: C223164; Supplier 1: LCSC; Category: Inductors; Supplier Part Number 1: C223164; Tolerance: ±10%; Rated Current: 70mA; Saturation Current: 70mA; DC Resistance: 1Ω; RoHS: Yes; ComponentLink1Description: Datasheet; ComponentLink1URL: https://wmsc.lcsc.com/wmsc/upload/file/pdf/v2/lcsc/2401231057_Taiyo-Yuden-CBMF1608T220K_C223164.pdf; ComponentLink2Description: JLCPCB Part URL; ComponentLink2URL: https://jlcpcb.com/partdetail/C223164; ComponentLink3Description: LCSC Part URL; ComponentLink3URL: https://lcsc.com/product-detail/Inductors-SMD_Taiyo-Yuden-Taiyo-Yuden-CBMF1608T220K_C223164.html
footprint IND-0603 (0603 (1608M) Inductor)
pins: 1, 2

## CH1608H2N2S_f_
designator L?  Inductance: 2.2nH
Inductor, 2.2nH, 200mΩ, 500mA, SMD 0603; Manufacturer: CEC(Shenzhen Zhenhua Fu Elec); Manufacturer Part Number: CH1608H2N2S(f); Self-Resonant Frequency: 3GHz; Q Factor: 8@100MHz; Package Size: 0603; JLCPCB Basic Part: No; JLCPCB Part Number: C316315; Supplier 1: LCSC; Category: Inductors; Supplier Part Number 1: C316315; Rated Current: 500mA; DC Resistance: 200mΩ; RoHS: Yes; ComponentLink1Description: Datasheet; ComponentLink1URL: https://wmsc.lcsc.com/wmsc/upload/file/pdf/v2/lcsc/2304140030_CEC-Shenzhen-Zhenhua-Fu-Elec-CH1608H2N2S-f_C316315.pdf; ComponentLink2Description: JLCPCB Part URL; ComponentLink2URL: https://jlcpcb.com/partdetail/C316315; ComponentLink3Description: LCSC Part URL; ComponentLink3URL: https://lcsc.com/product-detail/Inductors-SMD_CECShenzhen-Zhenhua-Fu-Elec-CECShenzhen-Zhenhua-Fu-Elec-CH1608H2N2Sf_C316315.html
footprint IND-0603 (0603 (1608M) Inductor)
pins: 1, 2
